# Altium footprint library PcbLib1.PcbLib: 49 footprints (part 3 of 4)
Each footprint in its own frame and in the unit in brackets; x right, y up, seen from the top. Pads: shape width x height; smd on the part's side, far side on the other; paste and mask are expansions set on the pad; w line width, h text height; cw(c..) or ccw(c..) is an arc to the next point about the centre after c.
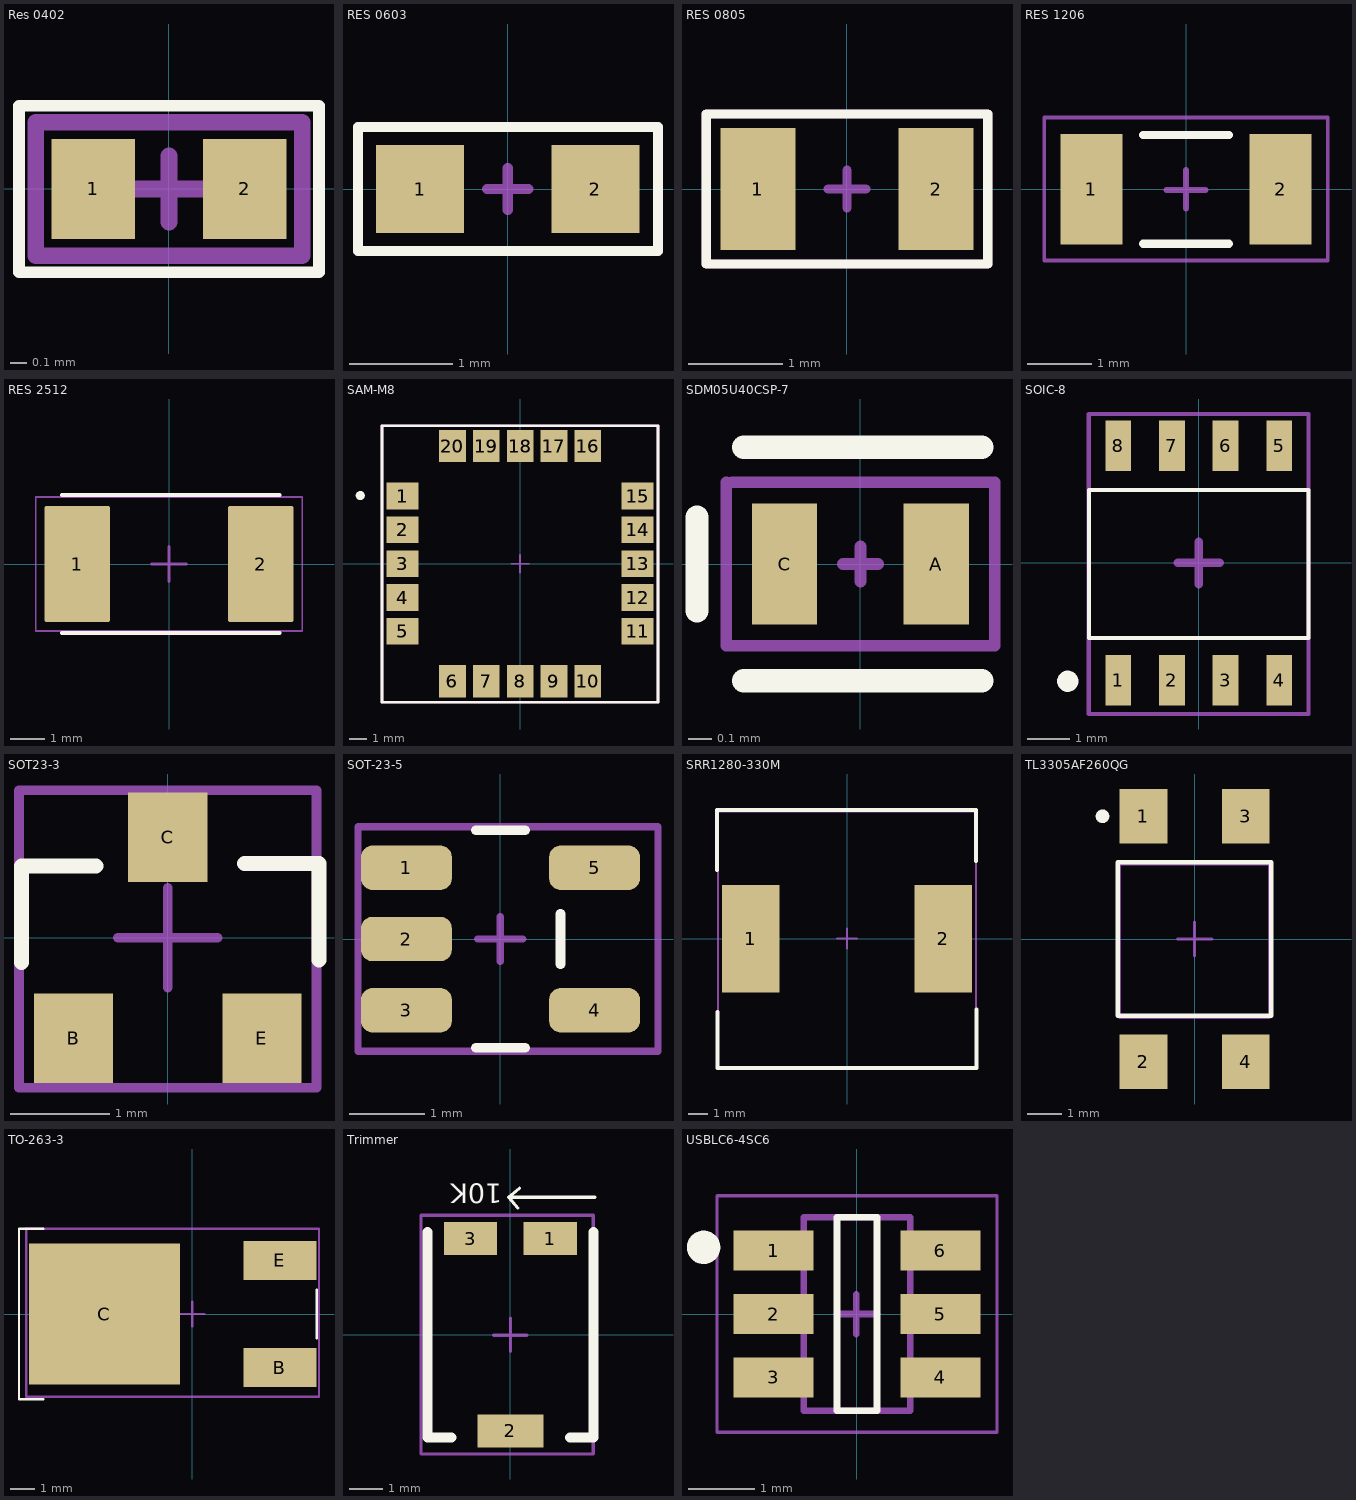
[diagram p2: the footprints below, top view; thin cyan lines are the x and y axes]

## PCBComponent_1 - duplicate [mm]

## Res 0402 [mm]
pads (2):
  rect 0.5x0.6 smd mask+0.05: 1(-0.455,0) 2(0.455,0)
Top Overlay:
  lines w0.07: -0.9,-0.5 -0.9,0.5 0.9,0.5 0.9,-0.5 -0.9,-0.5
Top Component Center:
  lines w0.1: -0.2,0 0.2,0 ; 0,-0.2 0,0.2 ; -0.8,-0.4 -0.8,0.4 0.8,0.4 0.8,-0.4 -0.8,-0.4
Top Designator:
  lines w0.1: -0.8,-0.4 -0.8,0.4 0.8,0.4 0.8,-0.4 -0.8,-0.4
  text "'.Designator'" at -0.656,-0.296 h0.3
3D body "res 0402.step": height 0.42, standoff 0.01, extent -0.575,-0.275 0.575,0.275

## RES 0603 [mm]
pads (2):
  rect 0.85x0.85 smd mask+0.05: 1(-0.85,0) 2(0.85,0)
Top Overlay:
  lines w0.1: -1.452,-0.6 1.456,-0.6 1.456,0.6 -1.452,0.6 -1.452,-0.6
Bottom 3D Body:
  lines w0.1: -0.2,0 0.2,0 ; 0,-0.2 0,0.2 ; -1.452,-0.6 1.456,-0.6 1.456,0.6 -1.452,0.6 -1.452,-0.6
Bottom Component Center:
  lines w0.1: -1.452,-0.6 1.456,-0.6 1.456,0.6 -1.452,0.6 -1.452,-0.6
  text "'.Designator'" at -1.3,-0.4 h0.4
3D body "res 0603.step": height 0.8, standoff 0, extent -1.23,-0.4 1.23,0.4

## RES 0805 [mm]
pads (2):
  rect 0.8x1.3 smd mask+0.05: 1(-0.95,0) 2(0.95,0)
Top Overlay:
  lines w0.1: -1.5,-0.8 -1.5,0.8 1.5,0.8 1.5,-0.8 -1.5,-0.8
Bottom 3D Body:
  lines w0.1: -0.2,0 0.2,0 ; 0,-0.2 0,0.2 ; -1.5,-0.8 1.5,-0.8 1.5,0.8 -1.5,0.8 -1.5,-0.8
Bottom Component Center:
  lines w0.1: -1.5,-0.8 -1.5,0.8 1.5,0.8 1.5,-0.8 -1.5,-0.8
  text "'.Designator'" at -1.4,-0.5 h0.6
3D body "res 0805.step": height 0.8, standoff 0, extent -1.4,-0.625 1.4,0.625

## RES 1206 [mm]
pads (2):
  rect 0.97x1.73 smd mask+0.075: 1(-1.48,0) 2(1.48,0)
Top Overlay:
  lines w0.127: -0.67,-0.85 0.67,-0.85 ; -0.67,0.85 0.67,0.85
Bottom 3D Body:
  lines w0.05: -2.215,-1.105 -2.215,1.125 2.215,1.125 2.215,-1.105 -2.215,-1.105
  lines w0.1: -0.302,-0.01 0.298,-0.01 ; 0,-0.3 0,0.3
Bottom Component Center:
  lines w0.05: -2.215,-1.115 2.215,-1.115 2.215,1.115 -2.215,1.115 -2.215,-1.115
  text "'.Designator'" at -2.2,-0.9 h0.8
3D body "step_temp.STEP": height 0.65, standoff 0, extent -1.55,-0.8 1.55,0.8

## RES 2512 [mm]
pads (2):
  rrect7% 1.9x3.37 smd: 1(-2.66,0) 2(2.66,0)
Top Overlay:
  lines w0.127: -3.1,-2 3.2,-2 ; -3.1,2 3.2,2
Bottom 3D Body:
  lines w0.05: -3.86,-1.94 3.86,-1.94 3.86,1.94 -3.86,1.94 -3.86,-1.94
  lines w0.1: -0.5,0 0.5,0 ; 0,-0.5 0,0.5
Bottom Component Center:
  lines w0.05: -3.86,-1.94 -3.86,1.94 3.86,1.94 3.86,-1.94 -3.86,-1.94
  text "'.Designator'" at -3.7,-1.3 h1.5
3D body "RES 2512.step": height 1.61, standoff 0.01, extent -3.175,-1.5 3.175,1.5

## SAM-M8 [mm]
pads (40):
  rect 1.8x1.5 smd paste-1.8: 1(-6.6,3.8) 1(-6.6,3.8) 2(-6.6,1.9) 2(-6.6,1.9) 3(-6.6,0) 3(-6.6,0) 4(-6.6,-1.9) 4(-6.6,-1.9) 5(-6.6,-3.8) 5(-6.6,-3.8) 11(6.6,-3.8) 11(6.6,-3.8) 12(6.6,-1.9) 12(6.6,-1.9) 13(6.6,0) 13(6.6,0) 14(6.6,1.9) 14(6.6,1.9) 15(6.6,3.8) 15(6.6,3.8)
  rect 1.5x1.8 smd paste-1.8: 6(-3.8,-6.6) 6(-3.8,-6.6) 7(-1.9,-6.6) 7(-1.9,-6.6) 8(0,-6.6) 8(0,-6.6) 9(1.9,-6.6) 9(1.9,-6.6) 10(3.8,-6.6) 10(3.8,-6.6) 16(3.8,6.6) 16(3.8,6.6) 17(1.9,6.6) 17(1.9,6.6) 18(0,6.6) 18(0,6.6) 19(-1.9,6.6) 19(-1.9,6.6) 20(-3.8,6.6) 20(-3.8,6.6)
Top Overlay:
  circle w0.254: c-8.975,3.825 r0.127
  lines w0.15: -7.751,-7.775 -7.751,-0.024 -7.751,7.741 7.741,7.741 7.741,-0.009 7.741,-7.774 -0.001,-7.774 -7.75,-7.774
Top Paste:
  region: 3.669,6.75 3.669,7.469 3.089,7.469 3.089,6.75
  region: 4.499,6.75 4.499,7.469 3.919,7.469 3.919,6.75
  region: 0.703,6.75 0.703,7.469 0.123,7.469 0.123,6.75
  region: -0.127,6.75 -0.127,7.469 -0.707,7.469 -0.707,6.75
  region: -3.103,6.75 -3.103,7.469 -3.683,7.469 -3.683,6.75
  region: 2.594,6.746 2.594,7.465 2.014,7.465 2.014,6.746
  region: 1.764,6.746 1.764,7.465 1.184,7.465 1.184,6.746
  region: -1.193,6.741 -1.193,7.46 -1.773,7.46 -1.773,6.741
  region: -2.023,6.741 -2.023,7.46 -2.603,7.46 -2.603,6.741
  region: 4.502,5.736 4.502,6.455 3.922,6.455 3.922,5.736
  region: 0.706,5.736 0.706,6.455 0.126,6.455 0.126,5.736
  region: -3.1,5.736 -3.1,6.455 -3.68,6.455 -3.68,5.736
  region: 3.665,5.732 3.665,6.451 3.085,6.451 3.085,5.732
  region: 2.597,5.732 2.597,6.451 2.017,6.451 2.017,5.732
  region: -0.131,5.732 -0.131,6.451 -0.711,6.451 -0.711,5.732
  region: 1.76,5.728 1.76,6.447 1.18,6.447 1.18,5.728
  region: -1.19,5.727 -1.19,6.446 -1.77,6.446 -1.77,5.727
  region: -2.027,5.723 -2.027,6.442 -2.607,6.442 -2.607,5.723
  region: 7.467,4.502 6.748,4.502 6.748,3.922 7.467,3.922
  region: 6.453,4.499 5.734,4.499 5.734,3.919 6.453,3.919
  region: 6.453,3.669 5.734,3.669 5.734,3.089 6.453,3.089
  region: 7.471,3.665 6.752,3.665 6.752,3.085 7.471,3.085
  region: 7.463,2.606 6.744,2.606 6.744,2.026 7.463,2.026
  region: 6.449,2.603 5.73,2.603 5.73,2.023 6.449,2.023
  region: 6.449,1.773 5.73,1.773 5.73,1.193 6.449,1.193
  region: 7.467,1.769 6.748,1.769 6.748,1.189 7.467,1.189
  region: 7.463,0.701 6.744,0.701 6.744,0.121 7.463,0.121
  region: 6.449,0.698 5.73,0.698 5.73,0.118 6.449,0.118
  region: 6.449,-0.132 5.73,-0.132 5.73,-0.712 6.449,-0.712
  region: 7.467,-0.136 6.748,-0.136 6.748,-0.716 7.467,-0.716
  region: 7.463,-1.2 6.744,-1.2 6.744,-1.78 7.463,-1.78
  region: 6.449,-1.203 5.73,-1.203 5.73,-1.783 6.449,-1.783
  region: -3.933,6.75 -3.933,7.469 -4.513,7.469 -4.513,6.75
  region: -3.937,5.732 -3.937,6.451 -4.517,6.451 -4.517,5.732
  region: -5.731,3.674 -6.45,3.674 -6.45,3.094 -5.731,3.094
  region: -5.731,1.769 -6.45,1.769 -6.45,1.189 -5.731,1.189
  region: -5.731,-0.136 -6.45,-0.136 -6.45,-0.716 -5.731,-0.716
  region: -5.735,0.701 -6.454,0.701 -6.454,0.121 -5.735,0.121
  region: -5.735,4.511 -6.454,4.511 -6.454,3.931 -5.735,3.931
  region: -5.735,2.606 -6.454,2.606 -6.454,2.026 -5.735,2.026
  region: -5.735,-1.2 -6.454,-1.2 -6.454,-1.78 -5.735,-1.78
  region: -6.749,4.508 -7.468,4.508 -7.468,3.928 -6.749,3.928
  region: -6.749,-0.132 -7.468,-0.132 -7.468,-0.712 -6.749,-0.712
  region: -6.749,2.603 -7.468,2.603 -7.468,2.023 -6.749,2.023
  region: -6.749,1.773 -7.468,1.773 -7.468,1.193 -6.749,1.193
  region: -6.749,3.678 -7.468,3.678 -7.468,3.098 -6.749,3.098
  region: -6.749,0.698 -7.468,0.698 -7.468,0.118 -6.749,0.118
  region: -6.749,-1.203 -7.468,-1.203 -7.468,-1.783 -6.749,-1.783
  region: 7.467,-2.037 6.748,-2.037 6.748,-2.617 7.467,-2.617
  region: 7.467,-3.933 6.748,-3.933 6.748,-4.513 7.467,-4.513
  region: 7.463,-3.096 6.744,-3.096 6.744,-3.676 7.463,-3.676
  region: 6.449,-2.033 5.73,-2.033 5.73,-2.613 6.449,-2.613
  region: 6.449,-3.099 5.73,-3.099 5.73,-3.679 6.449,-3.679
  region: 6.449,-3.929 5.73,-3.929 5.73,-4.509 6.449,-4.509
  region: 4.503,-7.469 4.503,-6.75 3.923,-6.75 3.923,-7.469
  region: 4.5,-6.455 4.5,-5.736 3.92,-5.736 3.92,-6.455
  region: 3.67,-6.455 3.67,-5.736 3.09,-5.736 3.09,-6.455
  region: 3.666,-7.473 3.666,-6.754 3.086,-6.754 3.086,-7.473
  region: 2.607,-7.46 2.607,-6.741 2.027,-6.741 2.027,-7.46
  region: 2.604,-6.446 2.604,-5.727 2.024,-5.727 2.024,-6.446
  region: 1.774,-6.446 1.774,-5.727 1.194,-5.727 1.194,-6.446
  region: 1.77,-7.464 1.77,-6.745 1.19,-6.745 1.19,-7.464
  region: 0.711,-7.469 0.711,-6.75 0.131,-6.75 0.131,-7.469
  region: 0.708,-6.455 0.708,-5.736 0.128,-5.736 0.128,-6.455
  region: -0.122,-6.455 -0.122,-5.736 -0.702,-5.736 -0.702,-6.455
  region: -0.126,-7.473 -0.126,-6.754 -0.706,-6.754 -0.706,-7.473
  region: -1.195,-7.462 -1.195,-6.743 -1.775,-6.743 -1.775,-7.462
  region: -1.198,-6.448 -1.198,-5.729 -1.778,-5.729 -1.778,-6.448
  region: -2.028,-6.448 -2.028,-5.729 -2.608,-5.729 -2.608,-6.448
  region: -2.032,-7.466 -2.032,-6.747 -2.612,-6.747 -2.612,-7.466
  region: -3.095,-7.469 -3.095,-6.75 -3.675,-6.75 -3.675,-7.469
  region: -3.098,-6.455 -3.098,-5.736 -3.678,-5.736 -3.678,-6.455
  region: -3.928,-6.455 -3.928,-5.736 -4.508,-5.736 -4.508,-6.455
  region: -3.932,-7.473 -3.932,-6.754 -4.512,-6.754 -4.512,-7.473
  region: -5.731,-2.037 -6.45,-2.037 -6.45,-2.617 -5.731,-2.617
  region: -5.731,-3.933 -6.45,-3.933 -6.45,-4.513 -5.731,-4.513
  region: -5.735,-3.096 -6.454,-3.096 -6.454,-3.676 -5.735,-3.676
  region: -6.749,-2.033 -7.468,-2.033 -7.468,-2.613 -6.749,-2.613
  region: -6.749,-3.099 -7.468,-3.099 -7.468,-3.679 -6.749,-3.679
  region: -6.749,-3.929 -7.468,-3.929 -7.468,-4.509 -6.749,-4.509
Bottom 3D Body:
  lines w0.1: -0.5,0 0.5,0 ; 0,-0.5 0,0.5
  lines w0.15: -7.751,-7.775 -7.751,-0.024 -7.751,7.741 7.741,7.741 7.741,-0.009 7.741,-7.774 -0.001,-7.774 -7.75,-7.774
Bottom Component Center:
  lines w0.15: -7.751,-7.775 -7.751,-0.024 -7.751,7.741 7.741,7.741 7.741,-0.009 7.741,-7.774 -0.001,-7.774 -7.75,-7.774
  text "'.Designator'" at -7.2,-1.8 h2
3D body "SAM-M8Q.STEP": height 6.36, standoff 0.01, extent -7.75,-7.725 7.75,7.775

## SDM05U40CSP-7 [mm]
pads (2):
  rect 0.28x0.52 smd paste+0 mask+0.05: A(0.325,0) C(-0.325,0)
Top Overlay:
  lines w0.1: -0.7,-0.2 -0.7,0.2 ; -0.5,-0.5 0.52,-0.5 ; -0.5,0.5 0.52,0.5
Bottom 3D Body:
  lines w0.05: -0.575,0.35 -0.575,-0.35 0.525,-0.35 0.575,-0.35 0.575,0.35 -0.55,0.35 ; -0.075,0 0.075,0 ; 0,-0.075 0,0.075
Bottom Component Center:
  lines w0.05: -0.575,0.35 -0.575,-0.35 0.525,-0.35 0.575,-0.35 0.575,0.35 -0.55,0.35
  text "'.Designator'" at -0.525,-0.275 h0.3
3D body "SDM05U40CSP-7.STEP": height 0.46, standoff 0.01, extent -0.5,-0.3 0.5,0.3

## SOIC-8 [mm]
pads (8):
  rect 0.61x1.2 smd paste+0 mask+0.05: 1(-1.905,-2.775) 2(-0.635,-2.775) 3(0.635,-2.775) 4(1.905,-2.775) 5(1.905,2.775) 6(0.635,2.775) 7(-0.635,2.775) 8(-1.905,2.775)
Top Overlay:
  circle w0.3: c-3.1,-2.8 r0.1
  lines w0.1: -2.6,-1.775 2.595,-1.775 2.595,1.725 -2.6,1.725 -2.6,-1.775
Bottom 3D Body:
  lines w0.1: -2.605,-3.575 2.595,-3.575 2.595,3.525 -2.605,3.525 -2.605,-3.575
  lines w0.2: -0.5,0 0.5,0 ; 0,-0.5 0,0.5
Bottom Component Center:
  lines w0.1: -2.605,-3.575 -2.605,3.525 2.595,3.525 2.595,-3.575 -2.605,-3.575
  text "'.Designator'" at -2.605,-0.675 h0.8
3D body "so8-3.step": height 1.7, standoff 0, extent -2.455,-2.975 2.445,3.025

## SOT23-3 [mm]
pads (3):
  rect 0.8x0.9 smd paste+0 mask+0.05: B(-0.95,-1.012) C(0,1.012) E(0.95,-1.012)
Top Overlay:
  lines w0.15: -1.475,-0.25 -1.475,0.725 -0.725,0.725 ; 0.775,0.75 1.525,0.75 1.525,-0.225
Bottom 3D Body:
  lines w0.1: -0.5,0 0.5,0 ; 0,-0.5 0,0.5 ; -1.5,-1.512 -1.5,1.488 1.5,1.488 1.5,-1.512 -1.5,-1.512
Bottom Component Center:
  lines w0.1: -1.5,-1.512 1.5,-1.512 1.5,1.488 -1.5,1.488 -1.5,-1.512
  text "'.Designator'" at -1.4,-0.5 h0.6
3D body "SOT-23.step": height 1.1, standoff 0, extent -1.5,-1.287 1.5,1.213

## SOT-23-5 [mm]
pads (5):
  rrect50% 1.21x0.59 smd mask+0.05: 1(-1.255,0.95) 2(-1.255,0) 3(-1.255,-0.95) 4(1.255,-0.95) 5(1.255,0.95)
Top Overlay:
  lines w0.127: -0.33,-1.45 0.33,-1.45 ; -0.33,1.45 0.33,1.45 ; 0.8,-0.335 0.8,0.335
Bottom 3D Body:
  lines w0.1: -0.3,0 0.3,0 ; 0,-0.3 0,0.3 ; -1.9,-1.5 -1.9,1.5 2.1,1.5 2.1,-1.5 -1.9,-1.5
Bottom Component Center:
  lines w0.1: -1.9,-1.5 2.1,-1.5 2.1,1.5 -1.9,1.5 -1.9,-1.5
  text "'.Designator'" at -1.8,-0.7 h0.7
3D body "SN74AUP1G80DBVR.STEP": height 1.31, standoff -0.14, extent -1.4,-1.45 1.4,1.45

## SRR1280-330M [mil]
pads (2):
  rect 114x213 smd paste+0 mask+0: 1(-191,0) 2(191,0)
Top Overlay:
  lines w7.87: -257.74,135.83 -257.74,255.45 256.26,255.45 256.26,153.54 ; -257,-145.67 -257,-257 257,-257 257,-140.75
Bottom 3D Body:
  lines w3.94: -19.68,0 19.68,0 ; 0,-19.68 0,19.68 ; -255.91,-255.91 -255.91,251.97 255.91,251.97 255.91,-255.91 -255.91,-255.91
Bottom Component Center:
  lines w3.94: -255.91,-255.91 255.91,-255.91 255.91,251.97 -255.91,251.97 -255.91,-255.91
  text "'.Designator'" at -220.47,-39.37 h118.11
3D body "IND_BOURNS_SRR1280.step": height 315, standoff 0, extent -252.01,-252.09 252.01,252.09

## TL3305AF260QG [mm]
pads (4):
  rect 1.4x1.6 smd: 1(-1.5,3.6) 2(-1.5,-3.6) 3(1.5,3.6) 4(1.5,-3.6)
Top Overlay:
  circle w0.2: c-2.7,3.6 r0.1
  lines w0.127: -2.25,-2.25 -2.25,2.25 2.25,2.25 2.25,-2.25 -2.25,-2.25
Bottom 3D Body:
  lines w0.1: -0.5,0 0.5,0 ; 0,-0.5 0,0.5 ; -2.2,-2.3 2.2,-2.3 2.2,2.2 -2.2,2.2 -2.2,-2.3
Bottom Component Center:
  lines w0.1: -2.2,-2.3 -2.2,2.2 2.2,2.2 2.2,-2.3 -2.2,-2.3
  text "'.Designator'" at -2,-1 h1
3D body: height 3.8, standoff 0, extent -2.25,-2.275 2.25,2.275
3D body: height 4.2, standoff 3.8, extent -2.25,-2.275 2.25,2.275
3D body: height 4.6, standoff 4.2, extent -1.6,-1.597 1.6,1.597
3D body: height 1, standoff 0, extent -1.8,2.2 -1.1,3.6
3D body: height 1, standoff 0, extent 1.2,2.2 1.9,3.6
3D body: height 1, standoff 0, extent -1.8,-3.6 -1.1,-2.2
3D body: height 1, standoff 0, extent 1.2,-3.6 1.9,-2.2

## TO-263-3 [mm]
pads (3):
  rect 3x1.6 smd paste+0 mask+0.05: B(3.6,-2.2) E(3.6,2.2)
  rect 6.2x5.8 smd paste+0 mask+0.05: C(-3.6,0)
Top Overlay:
  lines w0.1: -6.1,-3.5 -7.1,-3.5 -7.1,3.5 -6.1,3.5 ; 5.1,-1 5.1,1
Bottom 3D Body:
  lines w0.1: -0.5,0 0.5,0 ; 0,-0.5 0,0.5 ; -6.8,-3.4 -6.8,3.5 5.2,3.5 5.2,-3.4 -6.8,-3.4
Bottom Component Center:
  lines w0.1: -6.8,-3.4 5.2,-3.4 5.2,3.5 -6.8,3.5 -6.8,-3.4
  text "'.Designator'" at -6.4,-1.8 h2
3D body "TO-252-3.step": height 2.42, standoff 0.01, extent -5.85,-3.35 4.502,3.35

## Trimmer [mm]
pads (3):
  rect 1.6x1 smd paste+0 mask+0.05: 1(1.2,2.9) 3(-1.2,2.9)
  rect 2x1 smd paste+0 mask+0.05: 2(0,-2.9)
Top Overlay:
  lines w0.1: 0.22,3.825 -0.05,4.15 ; 0.275,4.42 -0.05,4.15 ; 2.55,4.15 -0.05,4.15
  lines w0.3: -2.5,3.1 -2.5,-3.1 -1.775,-3.1 ; 1.8,-3.1 2.5,-3.1 2.5,3.1
  text "10K" at -0.25,4.55 h0.6
Bottom 3D Body:
  lines w0.1: -0.509,-0.012 0.491,-0.012 ; 0,-0.5 0,0.5 ; -2.7,-3.6 -2.7,3.6 -2.6,3.6 2.5,3.6 2.5,-3.6 -2.7,-3.6
Bottom Component Center:
  lines w0.1: -2.7,-3.6 -2.7,3.6 -2.6,3.6 2.5,3.6 2.5,-3.6 -2.7,-3.6
  text "'.Designator'" at -1.7,3.4 h1.5
3D body "ST-4ETB10k_(103).stp": height 2.36, standoff 0.01, extent -2.5,-3.1 2.5,3.1

## USBLC6-4SC6 [mm]
pads (6):
  rect 1.2x0.6 smd mask+0.05: 1(-1.25,0.95) 2(-1.25,0) 3(-1.25,-0.95) 4(1.25,-0.95) 5(1.25,0) 6(1.25,0.95)
Top Overlay:
  circle w0.3: c-2.3,1 r0.1
  lines w0.1: -0.3,-1.45 0.3,-1.45 0.3,1.45 -0.3,1.45 -0.3,-1.45
Bottom 3D Body:
  lines w0.1: -0.3,0 0.3,0 ; -0.009,-0.303 -0.009,0.297 ; -0.8,-1.45 -0.8,1.45 0.8,1.45 0.8,-1.45 -0.8,-1.45
Bottom Component Center:
  lines w0.05: -2.1,-1.775 2.1,-1.775 2.1,1.775 -2.1,1.775 -2.1,-1.775
  text "'.Designator'" at -2,-0.8 h0.8
3D body "USBLC6-4SC6.STEP": height 1.43, standoff -0.02, extent -1.501,-1.463 1.3,1.462